# Altium schematic symbol library lib_datalogger.SchLib: 1246 symbols (part 5 of 16) (continued)
## CMP-006-00019-3
designator L?, comment PCMB063T-2R2MS  value 2.2µH  Case/Package: SMD/SMT  Pins: 2  Tolerance: 20%
Shielded Wirewound Inductor, 2.2 uH, +/- 20%, -20 to 120 degC, 2-Pin SMD, RoHS, Tape and Reel
footprint SUSUMU-PCMB063T_V (SMD, 2-Leads, Body 7.8x6.7mm)
footprint SUSUMU-PCMB063T_V (SMD, 2-Leads, Body 7.8x6.7mm)
pins: 1, 2

## CMP-006-00020-3
designator L?, comment VLS252010HBX-2R2M-1  value 2.2µH  Tolerance: 20%  Mounting Technology: SurfaceMount  Pins: 2
Inductor for Power Circuit, 2.2 uH, +/- 20%, -40 to 105 degC, 2-Pin SMD, RoHS, Tape and Reel
footprint SUSUMU-PCMB063T_V (SMD, 2-Leads, Body 7.8x6.7mm)
footprint TDK-VLS252010_V (SMD, 2-Leads, Body 2.5x2mm)
pins: 1, 2

## CMP-006-00021-1
designator L?, comment IND 6.8uH 11.5A SMD  Saturation Current: 11A  Tolerance: 20%  Core Material: Ferrite  RoHS Compliant: Yes  Case/Package: Nonstandard  Inductance: 6.8uH  Packaging: Tape and Reel  Min Operating Temperature: -40°C  Max Operating Temperature: 125°C  Shielding: Shielded  Self Resonant Frequency: 40MHz  Current Rating: 11.5A  Package Quantity: 400
FIXED IND 6.8UH 11.5A 15MOHM SMD; DC Resistance (DCR): 15mR; Series Resistance: 13.2mR; Test Frequency: 100kHz; RMS Current (Irms): 11.5A; Max DC Current: 11A; Number of Pins: 2; Termination: SMD/SMT; Resistor Type: Wirewound; Width: 0.394inch; Height - Seated (Max): 0.382inch; Length: 0.429inch; Mount: Surface Mount; REACH SVHC: Unknown; Height: 9.3mm; Series: WE-HCC; Inductance Tolerance: 20%; Lead Free: Lead Free
footprint WE-HCC-1090 (Inductor, 2-Leads, Body 10.9 x 10.0 mm)
pins: 1, 2

## CMP-007-000000-1
designator U?, comment IC MCP3208
ADC SAR 100ksps 12-bit Serial 16-Pin SOIC N; Part#: MCP9808T-E/MC; Manufacturer Part Number: MCP3208-CI/SL; Manufacturer: Microchip Technology; Differential Nonlinearity: 1LSB; Number of Converters: 1; Number of Channels: 8; Supply Type: Single; Full Scale Error: 5LSB; Sampling Rate: 100KS/s; MSRP: 0,85; Interface: SPI,Serial; eVendor#: MCP9808T-E/MCCT-ND; eVendorPrice: 1,13; eVendor: Digi-Key; Polarity: Unipolar; Max Supply Voltage: 5.5V; Output Voltage: 4.1V; Integral Nonlinearity (INL): 2LSB; Resolution: 12b; Signal to Noise Ratio (SNR): 100dB; Min Supply Voltage: 2.7V; Operating Supply Voltage: 5V; Number of Bits: 12; Nominal Supply Current: 320uA; ComponentLink4Description: https://datasheet.ciiva.com/8065/808967-8065814.pdf?src-supplier=Element14; Design Item ID: IC MCP3208; ComponentLink1URL: https://datasheet.ciiva.com/1256/21298e-1256787.pdf?src-supplier=Digi-Key; Mount: Surface Mount; ComponentLink3URL: https://datasheet.ciiva.com/3038/21298e-3038054.pdf?src-supplier=Avnet; Stock 1: 1106; ComponentLink5URL: https://datasheet.ciiva.com/16389/filehandler-aspxddocname-en011591-16389094.pdf?src-supplier=Future+Electronics; Number of A/D Converters: 1; Obs: --; Category: Analog to Digital Converters (ADCs); MOQ: 100; Number of Inputs: 8; Packaging: Rail/Tube; ComponentLink1Description: https://datasheet.ciiva.com/1256/21298e-1256787.pdf?src-supplier=Digi-Key; Case/Package: SOIC; ComponentLink2Description: https://datasheet.ciiva.com/18411/70045411-18411669.pdf?src-supplier=Allied+Electronics; Height: 1.25mm; ComponentLink2URL: https://datasheet.ciiva.com/18411/70045411-18411669.pdf?src-supplier=Allied+Electronics; Pricing 1: 1=3,48000, 25=2,90000, 100=2,64000 (USD); ComponentLink6URL: https://datasheet.ciiva.com/16608/21298e-16608950.pdf?src-supplier=Avnet+Europe; Min Operating Temperature: -40°C; RoHS: Yes; Lead Free: Lead Free; Package Quantity: 50; Number of Pins: 16; Contact Plating: Tin,Matte; Max Operating Temperature: 85°C; Number of Elements: 1; Radiation Hardening: No; ComponentLink7Description: https://datasheet.ciiva.com/14118/aqmicrochip-a-d-wandler-mcp3204-en-14118170.pdf?src-supplier=Distrelec; Length: 9.9mm; Datasheet: http://www.microchip.com/mymicrochip/filehandler.aspx?ddocname=en556196; Width: 3.9mm; ComponentLink3Description: https://datasheet.ciiva.com/3038/21298e-3038054.pdf?src-supplier=Avnet; Source: mits.SchLib; ComponentLink7URL: https://datasheet.ciiva.com/14118/aqmicrochip-a-d-wandler-mcp3204-en-14118170.pdf?src-supplier=Distrelec; ComponentLink4URL: https://datasheet.ciiva.com/8065/808967-8065814.pdf?src-supplier=Element14; Conversion Rate: 100KS/s; ComponentLink5Description: https://datasheet.ciiva.com/16389/filehandler-aspxddocname-en011591-16389094.pdf?src-supplier=Future+Electronics; ComponentLink6Description: https://datasheet.ciiva.com/16608/21298e-16608950.pdf?src-supplier=Avnet+Europe; REACH SVHC: No SVHC
footprint SOIC-SL16_N (SOIC, 16-Leads, Body 9.9x3.9mm, Pitch 1.27mm, IPC Medium Density)
footprint SOIC-SL16_N (SOIC, 16-Leads, Body 9.9x3.9mm, Pitch 1.27mm, IPC Medium Density)
pins: 1 CH0 (in), 2 CH1 (in), 3 CH2 (in), 4 CH3 (in), 5 CH4 (in), 6 CH5 (in), 7 CH6 (in), 8 CH7 (in), 9 DGND (power), 10 ~{CS}/SHDN (in), 11 DIN (in), 12 DOUT (hiz), 13 CLK (in), 14 AGND (power), 15 VREF (in), 16 VDD (power)

## CMP-007-00000-2
designator DS?, comment 16-219A/T2D-AR2T1QY/3T
Chip LED, White, 5 V, 10 mA, 30 mW, -40 to 85 degC, 2-Pin SMD (0402), RoHS, Tape and Reel; Manufacturer: Everlight Electronics; Luminous Intensity: 360mcd; Forward Voltage: 2.6V; Viewing Angle: 130degrees; Power: 30mW; Forward Current: 5mA; Package Quantity: 3000; Max Operating Temperature: 85°C; Datasheet Version: Rev. 5, 04/2013; Datasheet URL: http://www.everlight.com/file/ProductFile/16-219A-T2D-AR2T1QY-3T.pdf; Package Reference: 0402; Mounting Technology: SM; Case/Package: 0402; Illumination Colour: White; Manufacturer URL: http://www.everlight.com/; Package Description: 2-Pin Surface Mount Device, Body 1 x 0.5 mm; RoHS Compliant: True; Packaging: TapeandReel; Min Operating Temperature: -40°C
footprint EVRL-0402-2_V (SMD, 2-Leads, Body 1x0.5mm)
pins: 1 A, 2 K

## CMP-007-000001-1
designator U?, comment DC/DC CONVERTER 5V 1W
DC DC CONVERTER 5V 1W; Manufacturer Part Number: NKE0505SC; Manufacturer: Murata; Current - Output 1: 200mA; Efficiency: 69%; Isolation: Isolated; Min Input Voltage (DC): 4.5V; Isolation Voltage: 3kV; Number of Outputs: 1; Max Input Voltage: 5.5V; ComponentLink2Description: https://datasheet.ciiva.com/16470/kdc-nke-16470775.pdf?src-supplier=Future+Electronics; Packaging: Rail/Tube; RoHS: Yes; Design Item ID: DC/DC CONVERTER 5V 1W; Category: Voltage Regulators - Switching; Pricing 1: 1=5,08000, 5=5,05000, 10=5,02000, 25=4,96000, 50=4,84000, 100=4,60000, 250=4,30004, 500=4,01002, 1000=3,99000 (USD); ComponentLink1URL: https://datasheet.ciiva.com/26920/nke0505sc-26920257.pdf?src-supplier=IIIC; Max Output Power: 1W; REACH SVHC: No SVHC; Min Operating Temperature: -40°C; Max Power Dissipation: 1W; Lead Free: Lead Free; Length: 11.48mm; Nominal Input Voltage: 5V; Radiation Hardening: No; Max Output Current: 200mA; Mount: Through Hole; Voltage - Output 1: 5V; Max Operating Temperature: 85°C; Depth: 6mm; Stock 1: 4067; Case/Package: SIP; Source: mits.SchLib; Package Quantity: 40; ComponentLink2URL: https://datasheet.ciiva.com/16470/kdc-nke-16470775.pdf?src-supplier=Future+Electronics; Width: 0.24inch; ComponentLink3Description: https://datasheet.ciiva.com/8011/1790387-8011755.pdf?src-supplier=Element14; Number of Pins: 4; ComponentLink1Description: https://datasheet.ciiva.com/26920/nke0505sc-26920257.pdf?src-supplier=IIIC; Output Voltage: 5V; Nominal Output Voltage: 5V; Output Power: 1W; Height: 0.29inch; Flammability Rating: UL94 V-0; Min Input Voltage: 4.5V; Output Current: 200mA; Max Input Voltage (DC): 5.5V; ComponentLink3URL: https://datasheet.ciiva.com/8011/1790387-8011755.pdf?src-supplier=Element14
footprint B_XT-1WR2
footprint SIP_4
pins: 1 -VIN (power), 2 +VIN (power), 3 -VOUT (power), 4 +VOUT (power)

## CMP-007-00001-2
designator U?, comment 1655
Intelligent Control LED Integrated Light Source, 3.5 to 5.3 V, -25 to 80 degC, 4-Pin SMD, RoHS, Tape and Reel; Manufacturer: Adafruit Industries; RoHS Compliant: True; Case/Package: 1655; Package Description: 4-Pin Surface Mount Device, Body 5 x 5 mm; Manufacturer URL: https://www.adafruit.com/; Package Reference: 1655; Datasheet URL: http://datasheet.octopart.com/ADA1655-Adafruit-Industries-datasheet-32028139.pdf; Datasheet Version: May-13; Mounting Technology: SM
footprint ADA-RGB-1655_V (SMD, 4-Leads, Body 5x5mm)
pins: 1 VDD (power), 2 DOUT (out), 3 VSS (power), 4 DIN (in)

## CMP-00007-2
designator IC?, comment IC MC7805CT-BP REGULATOR TO-220
Standard Regulator Pos 5V 1.5A 3-Pin(3+Tab) TO-220 Bulk; Power Dissipation: 15kW; Max Input Voltage: 35V; Max Power Dissipation: 15W; Min Input Voltage: 7V; Number of Outputs: 1; Polarity: Positive; Power Supply Rejection Ratio (PSRR): 78dB; Dropout Voltage: 2V; Quiescent Current: 8mA; Output Type: Fixed; Nominal Output Voltage: 5V; Number of Pins: 3; Mount: Through Hole; Radiation Hardening: No; Package Quantity: 50; RoHS Compliant: Yes; Case/Package: TO-220; Packaging: Bulk; Series: -; Lead Free: Lead Free; Output Voltage: 5V; Max Operating Temperature: 125°C; Output Current: 1.5A; Number of Regulators: 1; Min Operating Temperature: 0°C; REACH SVHC: Unknown
footprint IC MC7805CT-BP REGULATOR TO-220-Footprint-1
pins: 1 IN (power), 2 GND (power), 3 OUT (power)

## CMP-007-000002-1
designator U?, comment DC/DC CONVERTER 24V / 12V 1W
DC/DC CONVERTER 24V/12V 1W; ComponentLink1Description: http://power.murata.com/data/power/ncl/kdc_nke.pdf; Design Item ID: DC/DC CONVERTER 24V / 12V 1W; ComponentLink1URL: http://power.murata.com/data/power/ncl/kdc_nke.pdf; Source: mits.SchLib
footprint B_XT-1WR2
pins: 1 -VIN (power), 2 +VIN (power), 3 -VOUT (power), 4 +VOUT (power)

## CMP-007-00002-2
designator DS?, comment 19-217-G7C-AN1P2-3T
Chip LED, Yellow-Green, 5 V, 25 mA, -40 to 85 degC, 2-Pin SMD (0603), RoHS, Tape and Reel; Manufacturer: Everlight Electronics; Forward Voltage: 2V; Lens Style: Clear; Viewing Angle: 120degrees; Colour: Green; Mounting Technology: SM; Datasheet Version: Rev. 1, 04/2006; Package Description: 2-Pin Surface Mount Device, Body 1.6 x 0.8 mm; RoHS Compliant: True; Package Reference: 0603; Pins: 2; Manufacturer URL: http://www.everlight.com/; Datasheet URL: https://datasheet.ciiva.com/48679/19-217-g7c-an1p2-3t-48679179.pdf; Case/Package: 0603
footprint EVRL-0603-2_V (SMD, 2-Leads, Body 1.6x0.8mm)
pins: 1 A, 2 K

## CMP-007-00003-2
designator DS?, comment 19-217/BHC-ZL1M2RY/3T
Chip LED, Blue, 5 V, 25 mA, -40 to 85 degC, 2-Pin SMD (0603), RoHS, Tape and Reel; Manufacturer: Everlight Electronics; Luminous Intensity: 28.5mcd; Viewing Angle: 120degrees; Forward Current: 25mA; Lens Style: Diffused; Forward Voltage: 3V; Pins: 2; Max Operating Temperature: 85°C; Manufacturer URL: http://www.everlight.com/; Datasheet URL: https://datasheet.ciiva.com/26901/getdatasheetpartid-420616-26901324.pdf; Package Reference: 0603; RoHS Compliant: True; Packaging: TapeandReel; Package Description: 2-Pin Surface Mount Device, Body 1.6 x 0.8 mm; Mounting Technology: SM; Datasheet Version: Rev. 1.0, 03/2003; Min Operating Temperature: -40°C; Case/Package: 0603; Colour: Blue
footprint EVRL-0603-2_V (SMD, 2-Leads, Body 1.6x0.8mm)
pins: 1 A, 2 K

## CMP-007-00004-2
designator DS?, comment 19-217/R6C-AL1M2VY/3T
Chip LED, Red, 5 V, 25 mA, -40 to 85 degC, 2-Pin SMD (0603), RoHS, Tape and Reel; Manufacturer: Everlight Electronics; Forward Voltage: 2.2V; Lens Style: Clear; Package Reference: 0603; Datasheet Version: Rev. 1, 01/2005; Mounting Technology: SM; RoHS Compliant: False; Datasheet URL: https://datasheet.ciiva.com/4688/el-19-217-r6c-al1m2vy-3tpdf-187026-4688713.pdf; Case/Package: 0603; Colour: Red; Manufacturer URL: http://www.everlight.com/; Package Description: 2-Pin Surface Mount Device, Body 1.6 x 0.8 mm
footprint EVRL-0603-2_V (SMD, 2-Leads, Body 1.6x0.8mm)
pins: 1 A, 2 K

## CMP-007-000005-1
designator S?, comment DC/DC CONVERTER NKE0303SC 3.3V 1W
DC/DC CONVERTER 3.3V 1W; Manufacturer: Murata Power Solutions Inc.; Efficiency: 72%; Voltage - Input (Min): 3V; Current - Output (Max): 303mA; Voltage - Isolation: 3kV (3000V); Voltage - Input (Max): 3.6V; Number of Outputs: 1; Voltage - Output 1: 3.3V; Voltage - Output 3: -; Operating Temperature: -40°C ~ 85°C; Packaging: Tube; Voltage - Output 2: -; Size / Dimension: 0.45" L x 0.24" W x 0.29" H (11.5mm x 6.0mm x 7.5mm); Mounting Type: Through Hole; Pricing 1: 1=7.61, 5=7.57, 10=7.52, 25=7.43, 50=7.25, 100=6.89, 250=6.45004, 500=6.01002, 1000=5.985 (USD); Type: Isolated Module; Manufacturer Part Number: NKE0303SC; Applications: ITE (Commercial); Part Status: Active; ComponentLink1URL: http://power.murata.com/data/power/ncl/kdc_nke.pdf; Source: mits.SchLib; Features: -; Package / Case: 4-SIP Module; RoHS: RoHS Compliant; Stock 1: 1554; Design Item ID: DC/DC CONVERTER NKE0303SC 3.3V 1W; Power (Watts) - Manufacture Series: 1W; Category: Power Supplies - Board Mount; ComponentLink1Description: http://power.murata.com/data/power/ncl/kdc_nke.pdf
footprint SWITCH_TOGGLE_TH
footprint SIP_4
pins: 1, 2

## CMP-007-00005-2
designator DS?, comment 19-217/Y5C-AM1N1VY/3T
Chip LED, Yellow, 5 V, 25mA, -40 to 85 degC, 2-Pin SMD (0603), RoHS, Tape and Reel; Manufacturer: Everlight Electronics; Datasheet Version: Rev. 1.0, 12/2005; Package Reference: 0603; Mounting Technology: SM; Package Description: 2-Pin Surface Mount Device, Body 1.6 x 0.8 mm; Case/Package: 0603; Datasheet URL: http://www.fairchip.com/pdf/Everlight/19-217-Y5C-AM1N1VY-3T.pdf; Manufacturer URL: http://www.everlight.com/; RoHS Compliant: False
footprint EVRL-0603-2_V (SMD, 2-Leads, Body 1.6x0.8mm)
pins: 1 A, 2 K

## CMP-007-000006-1
designator U?, comment DC/DC CONVERTER PHP1S5S5MTR 5V 1W
DC DC CONVERTER 5V 1W; Manufacturer: CUI; Manufacturer Part Number: PHP1-S5-S5-M-TR; Isolation Voltage: 2kV; Min Input Voltage: 4.5V; Max Output Current: 200mA; Max Input Voltage: 5.5V; Efficiency: 75%; Number of Outputs: 1; Max Power Dissipation: 1W; Category: Board Mount Modules; ComponentLink1Description: http://power.murata.com/data/power/ncl/kdc_nke.pdf; ComponentLink1URL: http://power.murata.com/data/power/ncl/kdc_nke.pdf; Voltage - Output 1: 5V; Length: 0.5inch; ComponentLink3URL: http://www.cui.com/product/resource/digikeypdf/php1-m.pdf?src-supplier=Digi-Key; Design Item ID: DC/DC CONVERTER PHP1S5S5MTR 5V 1W; Source: mits.SchLib; Case/Package: SMD/SMT; Height: 0.26inch; ComponentLink3Description: http://www.cui.com/product/resource/digikeypdf/php1-m.pdf?src-supplier=Digi-Key; Packaging: Rail/Tube; Pricing 1: 1=3,98000, 5=3,92600, 10=3,87000, 25=3,75600, 50=3,64200, 100=3,52830, 250=3,41444 (USD); Min Operating Temperature: -40°C; Max Operating Temperature: 100°C; Width: 0.42inch; ComponentLink2Description: https://www.cui.com/product/resource/digikeypdf/php1-m.pdf?src-supplier=Digi-Key; Stock 1: 1306; RoHS: Yes; ComponentLink2URL: https://www.cui.com/product/resource/digikeypdf/php1-m.pdf?src-supplier=Digi-Key; Lead Free: Lead Free; Mount: Through Hole
footprint B_XT-1WR2
footprint B_XT-1WR2
pins: 1 -VIN (power), 2 +VIN (power), 3 -VOUT (power), 4 +VOUT (power)

## CMP-007-00006-2
designator DS?, comment 304090040
Green LED, 80 mW, 20 mA, -25 to 85 degC, 2-Pin THD; Manufacturer: Shenzhen CGX; Manufacturer URL: http://szcgx.com/; Package Reference: 304090040; Datasheet Version: Rev. 1.0, 09/2014; RoHS Compliant: Unknown; Case/Package: 304090040; Package Description: 2-Pin Through Hole Device, Dia 3 mm, Pitch 2.28 mm; Datasheet URL: http://datasheet.octopart.com/304090040-Chengguangxing-datasheet-62330655.pdf; Mounting Technology: TH
footprint LED-2P-2.28-3MM (LED, 2-Leads, Dia 3mm, Pitch 2.28mm)
pins: 1 A, 2 K

## CMP-007-00007-2
designator DS?, comment 304090041
Red LED, 80 mW, 30 mA, -25 to 85 degC, 2-Pin THD; Manufacturer: Shenzhen CGX; Package Description: 2-Pin Through Hole Device, Dia 3 mm, Pitch 2.28 mm; Datasheet URL: http://datasheet.octopart.com/304090041-Chengguangxing-datasheet-62330656.pdf; Mounting Technology: TH; Manufacturer URL: http://szcgx.com/; RoHS Compliant: Unknown; Datasheet Version: Sep-14; Case/Package: 304090041; Package Reference: 304090041
footprint LED-2P-2.28-3MM_A (LED, 2-Leads, Dia 3mm, Pitch 2.28mm)
pins: 1 A, 2 K

## CMP-007-00008-2
designator DS?, comment G502DC
Green LED, 80 mW, 20 mA, -25 to 85 degC, 2-Pin THD; Manufacturer: Shenzhen CGX; Mounting Technology: TH; Package Reference: G502DC; Datasheet Version: Sep-14; Manufacturer URL: http://szcgx.com/; Package Description: 2-Pin Through Hole Device, Dia 5.9 mm; Datasheet URL: http://datasheet.octopart.com/G502DC-Chengguangxing-datasheet-62330340.pdf; Case/Package: G502DC; RoHS Compliant: Unknown
footprint CGX-G502DC (THD, 2-Leads, Dia 5.9mm, Pin Spacing 2.54mm)
pins: 1 A, 2 K

## CMP-007-00009-3
designator DS?, comment UR502DC
Red LED, 80 mW, 30 mA, -25 to 85 degC, 2-Pin THD; Manufacturer: Shenzhen CGX; Power: 80mW; Manufacturer URL: http://szcgx.com/; Package Description: 2-Pin Through Hole Device, Dia 5.9 mm, Height 9.1 mm; Case/Package: UR502DC; RoHS Compliant: Unknown; Package Reference: UR502DC; Mounting Technology: TH; Datasheet URL: http://datasheet.octopart.com/UR502DC-Chengguangxing-datasheet-62330342.pdf; Datasheet Version: Sep-14
footprint CGX-UR502DC (THD, 2-Leads, Dia 5.9mm, Pin Spacing 2.54mm)
footprint CGX-UR502DC (THD, 2-Leads, Dia 5.9mm, Pin Spacing 2.54mm)
pins: 1 A, 2 K

## CMP-007-00010-2
designator DS?, comment WP7113SGD
LED Green, 62.5 mW, 25 mA, -40 to 85 degC, 2-Pin THD, RoHS, Bulk; Manufacturer: Kingbright; Lens Style: Dome; Nominal Vf: 2.2V; Power: 62.5mW; Luminous Intensity: 40mcd; Viewing Angle: 30degrees; Datasheet URL: http://www.kingbrightusa.com/images/catalog/SPEC/WP7113SGD.pdf; Datasheet Version: Rev. 6B, 01/2015; Illumination Colour: Green; Package Quantity: 1000; Package Description: 2-Pin Through Hole Device, Dia 5.9 mm, Body Length 8.6 mm; Colour: Green; Case/Package: Radial; RoHS Compliant: True; Package Reference: WP7113SGD; Mounting Technology: TH; Packaging: Bulk; Forward Voltage: 2.2V
footprint KING-WP7113SGD_V (THD, 2-Leads, Dia 5.9mm, Body Length 8.6mm)
pins: 1 A, 2 K

## CMP-007-00011-2
designator DS?, comment HSMA-C190
LED Uni-Color Amber, 60 mW, 20 mA, -40 to 85 degC, 2-Pin SMD, RoHS, Tape and Reel; Manufacturer: Avago; Forward Current: 20mA; Colour: Orange; Luminous Intensity: 90mcd; Lens Style: Diffused; Power: 60mW; Nominal Vf: 1.9V; Viewing Angle: 170degrees; Datasheet Version: Sep-10; Mounting Technology: SM; Case/Package: 0603; RoHS Compliant: True; Pins: 2; Packaging: TapeandReel; Package Reference: HSMX-C190; Manufacturer URL: http://www.avagotech.com/; Package Quantity: 4000; Min Operating Temperature: -40°C; Datasheet URL: http://docs.avagotech.com/docs/AV02-0112EN; Max Operating Temperature: 85°C; Forward Voltage: 1.9V; Package Description: 2-Pin Surface Mount Device, Body 1.6 x 0.8 mm, Height 0.9 mm; Illumination Colour: Orange
footprint AVAG-HSMX-C190_V (SMD, 2-Leads, Body 1.6x0.8mm, Height 0.9mm)
pins: 1 A, 2 K

## CMP-007-00012-2
designator DS?, comment HSMD-C190
LED Uni-Color Orange, 52 mW, 20 mA, -40 to 85 degC, 2-Pin SMD, RoHS, Tape and Reel; Manufacturer: Avago; Lens Style: Diffused; Forward Voltage: 2.2V; Forward Current: 20mA; Viewing Angle: 170degrees; Power: 52mW; Luminous Intensity: 8mcd; Min Operating Temperature: -40°C; Packaging: TapeandReel; Colour: Orange; Nominal Vf: 2.2V; Pins: 2; Case/Package: 0603; Max Operating Temperature: 85°C; Illumination Colour: Orange; Package Description: 2-Pin Surface Mount Device, Body 1.6 x 0.8 mm, Height 0.9 mm; Manufacturer URL: http://www.avagotech.com/; Datasheet Version: Mar-12; RoHS Compliant: True; Datasheet URL: http://docs.avagotech.com/docs/AV02-0551EN; Mounting Technology: SM; Package Reference: HSMX-C190; Package Quantity: 4000
footprint AVAG-HSMX-C190_V (SMD, 2-Leads, Body 1.6x0.8mm, Height 0.9mm)
pins: 1 A, 2 K

## CMP-007-00013-2
designator DS?, comment HSMG-C190
LED Uni-Color Green, 52 mW, 20 mA, -40 to 85 degC, 2-Pin SMD, RoHS, Tape and Reel; Manufacturer: Avago; Forward Current: 20mA; Viewing Angle: 170degrees; Luminous Intensity: 15mcd; Lens Style: Diffused; Forward Voltage: 2.2V; Power: 52mW; Mounting Technology: SM; RoHS Compliant: True; Packaging: TapeandReel; Illumination Colour: Green; Datasheet URL: http://docs.avagotech.com/docs/AV02-0551EN; Min Operating Temperature: -40°C; Max Operating Temperature: 85°C; Pins: 2; Package Description: 2-Pin Surface Mount Device, Body 1.6 x 0.8 mm, Height 0.9 mm; Nominal Vf: 2.2V; Case/Package: 0603; Manufacturer URL: http://www.avagotech.com/; Datasheet Version: Mar-12; Colour: Green; Package Reference: HSMX-C190; Package Quantity: 4000
footprint AVAG-HSMX-C190_V (SMD, 2-Leads, Body 1.6x0.8mm, Height 0.9mm)
pins: 1 A, 2 K

## CMP-007-00014-2
designator DS?, comment HSMH-C190
LED Uni-Color Red, 65 mW, 20 mA, -40 to 85 degC, 2-Pin SMD, RoHS, Tape and Reel; Manufacturer: Avago; Nominal Vf: 1.8V; Luminous Intensity: 17mcd; Power: 78mW; Forward Current: 20mA; Lens Style: Diffused; Viewing Angle: 170degrees; Package Quantity: 4000; Colour: Red; Manufacturer URL: http://www.avagotech.com/; Min Operating Temperature: -40°C; Datasheet URL: http://docs.avagotech.com/docs/AV02-0551EN; RoHS Compliant: True; Forward Voltage: 1.8V; Pins: 2; Max Operating Temperature: 85°C; Packaging: TapeandReel; Package Reference: HSMX-C190; Datasheet Version: Mar-12; Package Description: 2-Pin Surface Mount Device, Body 1.6 x 0.8 mm, Height 0.9 mm; Case/Package: 0603; Mounting Technology: SM; Illumination Colour: Red
footprint AVAG-HSMX-C190_V (SMD, 2-Leads, Body 1.6x0.8mm, Height 0.9mm)
pins: 1 A, 2 K

## CMP-007-00015-2
designator DS?, comment HSMR-C190
LED Uni-Color Blue, 78 mW, 20 mA, -40 to 85 degC, 2-Pin SMD, RoHS, Tape and Reel; Manufacturer: Avago; Forward Voltage: 3.4V; Power: 78mW; Forward Current: 20mA; Luminous Intensity: 55mcd; Lens Style: Diffused; Viewing Angle: 155degrees; Pins: 2; Max Operating Temperature: 85°C; Colour: Blue; Datasheet Version: Apr-10; RoHS Compliant: True; Mounting Technology: SM; Min Operating Temperature: -40°C; Illumination Colour: Blue; Package Quantity: 4000; Datasheet URL: http://docs.avagotech.com/docs/AV02-0977EN; Package Reference: HSMX-C190; Packaging: TapeandReel; Nominal Vf: 3.4V; Case/Package: 0603; Package Description: 2-Pin Surface Mount Device, Body 1.6 x 0.8 mm, Height 0.9 mm; Manufacturer URL: http://www.avagotech.com/
footprint AVAG-HSMX-C190_V (SMD, 2-Leads, Body 1.6x0.8mm, Height 0.9mm)
pins: 1 A, 2 K

## CMP-007-00016-2
designator DS?, comment HSMW-C191
LED Uni-Color White, 78 mW, 20 mA, -40 to 85 degC, 2-Pin SMD, RoHS, Tape and Reel; Manufacturer: Avago; Power: 78mW; Lens Style: Diffused; Luminous Intensity: 200mcd; Forward Voltage: 3.6V; Viewing Angle: 140degrees; Forward Current: 20mA; Illumination Colour: White; Package Quantity: 4000; Mounting Technology: SM; Colour: White; Case/Package: 0603; Package Reference: HSMW-C191; Datasheet Version: May-10; Pins: 2; Package Description: 2-Pin Surface Mount Device, Body 1.6 x 0.8 mm; Min Operating Temperature: -40°C; RoHS Compliant: True; Packaging: TapeandReel; Manufacturer URL: http://www.avagotech.com/; Datasheet URL: http://docs.avagotech.com/docs/AV02-0186EN; Nominal Vf: 3.6V; Max Operating Temperature: 85°C
footprint AVAG-HSMW-C191_V (SMD, 2-Leads, Body 1.6x0.8mm)
pins: 1 A, 2 K

## CMP-007-00017-2
designator DS?, comment HSMY-C190
LED Uni-Color Yellow, 65 mW, 20 mA, -40 to 85 degC, 2-Pin SMD, RoHS, Tape and Reel; Manufacturer: Avago; Forward Current: 20mA; Viewing Angle: 170degrees; Power: 52mW; Lens Style: Diffused; Nominal Vf: 2.1V; Luminous Intensity: 8mcd; Max Operating Temperature: 85°C; Package Quantity: 4000; Package Description: 2-Pin Surface Mount Device, Body 1.6 x 0.8 mm, Height 0.9 mm; Packaging: TapeandReel; Case/Package: 0603; Datasheet Version: Mar-12; Min Operating Temperature: -40°C; Pins: 2; Illumination Colour: Yellow; Package Reference: HSMX-C190; Colour: Yellow; Manufacturer URL: http://www.avagotech.com/; Datasheet URL: http://docs.avagotech.com/docs/AV02-0551EN; Forward Voltage: 2.1V; RoHS Compliant: True; Mounting Technology: SM
footprint AVAG-HSMX-C190_V (SMD, 2-Leads, Body 1.6x0.8mm, Height 0.9mm)
pins: 1 A, 2 K

## CMP-007-00018-2
designator DS?, comment LTL-1CHE
LED Uni-Color Red, 100 mW, 30 mA, -55 to 100 degC, 2-Pin THD, RoHS, Bulk; Manufacturer: Lite-On; Forward Current: 20mA; Nominal Vf: 2V; Viewing Angle: 60degrees; Luminous Intensity: 12.6mcd; Lens Style: Dome; Pins: 2; RoHS Compliant: True; Package Reference: LTL-1CHE; Package Quantity: 1000; Mounting Technology: TH; Min Operating Temperature: -55°C; Colour: Red; Case/Package: Radial; Manufacturer URL: http://www.us.liteon.com/; Datasheet URL: https://datasheet.ciiva.com/15117/getdatasheetpartid-187746-15117985.pdf; Forward Voltage: 2V; Max Operating Temperature: 100°C; Illumination Colour: Red; Package Description: 2-Pin Through Hole Device, Dia 3.8 mm, Pitch 2.54 mm; Packaging: Bulk; Datasheet Version: Dec-03
footprint INDPR60-254-520X380X650 (THD, 2-Leads, Dia 3.8mm, Pitch 2.54mm)
pins: 1 A, 2 K

## CMP-007-00019-2
designator DS?, comment LTL-1CHG
LED Uni-Color Green, 100 mW, 30 mA, -55 to 100 degC, 2-Pin THD, RoHS, Bulk; Manufacturer: Lite-On; Power: 100mW; Forward Voltage: 2.6V; Forward Current: 30mA; Nominal Vf: 2.1V; Lens Style: Dome; Viewing Angle: 60degrees; Luminous Intensity: 12.6mcd; Max Operating Temperature: 100°C; Case/Package: Radial; Package Reference: LTL-1CHG; Manufacturer URL: http://www.us.liteon.com/; Package Quantity: 1000; Colour: Green; Packaging: Bulk; RoHS Compliant: True; Datasheet URL: http://datasheet.octopart.com/LTL-1CHG-Lite-On-datasheet-143841.pdf; Package Description: 2-Pin Through Hole Device, Dia 3.8 mm; Min Operating Temperature: -55°C; Mounting Technology: TH; Pins: 2; Illumination Colour: Green; Datasheet Version: Mar-00
footprint LTST-LTL-1CHG-2 (TH, 2-Leads, Dia 3.8mm)
pins: 1 A, 2 K

## CMP-007-00020-2
designator DS?, comment LTL-1CHYE
LED Uni-Color Yellow, 60 mW, 20 mA, -55 to 100 degC, 2-Pin THD, RoHS, Bulk; Manufacturer: Lite-On; Nominal Vf: 2.1V; Luminous Intensity: 40mcd; Lens Style: Dome; Forward Current: 20mA; Viewing Angle: 45degrees; Max Operating Temperature: 100°C; Case/Package: Radial; Min Operating Temperature: -55°C; Colour: Yellow; Datasheet Version: Rev. B, 07/2013; Packaging: Bulk; Illumination Colour: Yellow; Package Quantity: 1000; Pins: 2; Package Reference: LTL-1CHYE; Forward Voltage: 2.1V; Mounting Technology: TH; Datasheet URL: https://datasheet.ciiva.com/4269/s-110-ltl-1chye-4269126.pdf; RoHS Compliant: True; Package Description: 2-Pin Through Hole Device, Dia 3.8 mm, Pitch 2.54 mm; Manufacturer URL: http://www.us.liteon.com/
footprint LTST-LTL-1CHYE (THD, 2-Leads, Dia 3.8mm, Pitch 2.54mm)
pins: 1 A, 2 K

## CMP-007-00021-2
designator DS?, comment LTST-C190AKT
LED Uni-Color Orange, 100 mW, 30 mA, -55 to 85 degC, 2-Pin SMD, RoHS, Tape and Reel; Manufacturer: Lite-On; Lens Style: Clear; Forward Voltage: 2.1V; Luminous Intensity: 2mcd; Forward Current: 20mA; Viewing Angle: 130degrees; Package Reference: LTST-C190AKT-2; Case/Package: 0603; Min Operating Temperature: -55°C; Package Quantity: 3000; Illumination Colour: Orange; RoHS Compliant: True; Mounting Technology: SM; Manufacturer URL: http://www.us.liteon.com/; Datasheet URL: http://datasheet.octopart.com/LTST-C190AKT-Lite-On-datasheet-11729267.pdf; Pins: 2; Max Operating Temperature: 85°C; Packaging: TapeandReel; Colour: Orange; Nominal Vf: 2.1V; Datasheet Version: Jan-03; Package Description: 2-Pin Surface Mount Device, Body 1.6 x 0.8 mm
footprint LTST-C190AKT-2_V (SMD, 2-Leads, Body 1.6x0.8mm)
pins: 1 A, 2 K

## CMP-007-00022-2
designator DS?, comment LTST-C190GKT
LED Uni-Color Green, 100 mW, 30 mA, -55 to 85 degC, 2-Pin SMD, RoHS, Tape and Reel; Manufacturer: Lite-On; Power: 100mW; Forward Voltage: 2.1V; Viewing Angle: 130degrees; Forward Current: 20mA; Luminous Intensity: 6mcd; Lens Style: Clear; Manufacturer URL: http://www.us.liteon.com/; RoHS Compliant: True; Colour: Green; Package Description: 2-Pin Surface Mount Device, Body 1.6 x 0.8 mm; Datasheet URL: http://datasheet.octopart.com/LTST-C190GKT-Lite-On-datasheet-158530.pdf; Datasheet Version: Dec-06; Mounting Technology: SM; Case/Package: 0603; Package Reference: C190GKT; Packaging: TapeandReel; Min Operating Temperature: -55°C; Nominal Vf: 2.1V; Package Quantity: 3000; Illumination Colour: Green; Max Operating Temperature: 85°C; Pins: 2
footprint LTST-C190GKT_V (SMD, 2-Leads, Body 1.6x0.8mm)
pins: 1 A, 2 K

## CMP-007-00023-2
designator DS?, comment LTST-C190KFKT
LED Uni-Color Orange, 75 mW, 30 mA, -35 to 85 degC, 2-Pin SMD, RoHS, Tape and Reel; Manufacturer: Lite-On; Power: 75mW; Luminous Intensity: 90mcd; Nominal Vf: 2V; Lens Style: Diffused; Forward Current: 20mA; Viewing Angle: 130degrees; Max Operating Temperature: 85°C; Manufacturer URL: http://www.us.liteon.com/; Package Description: 2-Pin Surface Mount Device, Body 1.6 x 0.8 mm; Package Quantity: 3000; Pins: 2; Min Operating Temperature: -55°C; Mounting Technology: SM; Colour: Orange; Packaging: TapeandReel; Case/Package: 0603; Datasheet Version: Rev. I, 09/2011; Illumination Colour: Orange; Datasheet URL: http://optoelectronics.liteon.com/upload/download/DS-22-99-0186/S_110_LTST-C190KFKT.pdf; Package Reference: C190KFKT; RoHS Compliant: True; Forward Voltage: 2V
footprint LTST-C190KFKT_V (SMD, 2-Leads, Body 1.6x0.8mm)
pins: 1 A, 2 K

## CMP-007-00024-2
designator DS?, comment LTST-C190KRKT
LED Uni-Color Red, 62.5 mW, 25 mA, -30 to 85 degC, 2-Pin SMD, RoHS, Tape and Reel; Manufacturer: Lite-On; Power: 75mW; Forward Voltage: 2V; Luminous Intensity: 54mcd; Lens Style: Diffused; Viewing Angle: 130degrees; Forward Current: 20mA; Manufacturer URL: http://www.us.liteon.com/; Case/Package: 0603; Datasheet Version: Rev. F, 05/2013; Package Reference: C191KRKT; Datasheet URL: http://optoelectronics.liteon.com/upload/download/DS-22-99-0151/S_110_LTST-C190KRKT.pdf; Package Description: 2-Pin Surface Mount Device, Body 1.6 x 0.8 mm; Nominal Vf: 2V; Packaging: TapeandReel; RoHS Compliant: True; Pins: 2; Illumination Colour: Red; Colour: Red; Mounting Technology: SM; Package Quantity: 3000; Min Operating Temperature: -55°C; Max Operating Temperature: 85°C
footprint LTST-C191KRKT_V (SMD, 2-Leads, Body 1.6x0.8mm)
pins: 1 A, 2 K

## CMP-007-00025-2
designator DS?, comment LTST-C190KSKT
LED Uni-Color Yellow, 75 mW, 30 mA, -30 to 85 degC, 2-Pin SMD, RoHS, Tape and Reel; Manufacturer: Lite-On; Lens Style: Diffused; Forward Current: 20mA; Nominal Vf: 2.1V; Forward Voltage: 2V; Luminous Intensity: 28mcd; Viewing Angle: 130degrees; Power: 75mW; Case/Package: 0603; Datasheet URL: http://optoelectronics.liteon.com/upload/download/DS-22-99-0189/S_110_LTST-C190KSKT.pdf; Min Operating Temperature: -55°C; Illumination Colour: Yellow; Package Quantity: 3000; Datasheet Version: Rev. I, 10/2012; Colour: Yellow; Package Reference: C190KSKT; Package Description: 2-Pin Surface Mount Device, Body 1.6 x 0.8 mm; Max Operating Temperature: 85°C; Manufacturer URL: http://www.us.liteon.com/; Pins: 2; Mounting Technology: SM; RoHS Compliant: True; Packaging: TapeandReel
footprint LTST-C190KSKT_V (SMD, 2-Leads, Body 1.6x0.8mm)
pins: 1 A, 2 K

## CMP-007-00026-2
designator DS?, comment LTST-C190TBKT
LED Uni-Color Blue, 76 mW, 20 mA, -20 to 80 degC, 2-Pin SMD, RoHS, Tape and Reel; Manufacturer: Lite-On; Forward Voltage: 2.8V; Lens Style: Diffused; Luminous Intensity: 28mcd; Forward Current: 20mA; Viewing Angle: 130degrees; Nominal Vf: 3.3V; Packaging: TapeandReel; Min Operating Temperature: -20°C; Illumination Colour: Blue; Package Quantity: 3000; Pins: 2; Mounting Technology: SM; Package Reference: C190TBKT-2; Package Description: 2-Pin Surface Mount Device, Body 1.6 x 0.8 mm; RoHS Compliant: True; Datasheet URL: http://optoelectronics.liteon.com/upload/download/DS-22-99-0224/S_110_LTST-C190TBKT(0630).pdf; Datasheet Version: Rev. K, 08/2011; Manufacturer URL: http://www.us.liteon.com/; Colour: Blue; Case/Package: 0603; Max Operating Temperature: 80°C
footprint LTST-C190TBKT-2_V (SMD, 2-Leads, Body 1.6x0.8mm)
pins: 1 A, 2 K

## CMP-007-00027-2
designator DS?, comment LTW-C191TS5
LED Uni-Color White, 70 mW, 20 mA, -20 to 80 degC, 2-Pin SMD, RoHS, Tape and Reel; Manufacturer: Lite-On; Power: 70mW; Forward Current: 5mA; Viewing Angle: 130degrees; Luminous Intensity: 28mcd; Lens Style: Diffused; Nominal Vf: 2.93V; Forward Voltage: 3.15V; Pins: 2; Illumination Colour: White; Datasheet Version: Rev. B, 06/2010; Package Quantity: 1; Colour: White; Package Reference: LTW-C191TS5; Mounting Technology: SM; Package Description: 2-Pin Surface Mount Device, Body 1.6 x 0.8 mm; Manufacturer URL: http://www.us.liteon.com/; Datasheet URL: http://optoelectronics.liteon.com/upload/download/DS22-2004-201/S_110_LTW-C191TS5.pdf; Max Operating Temperature: 80°C; Case/Package: 0603; RoHS Compliant: True; Min Operating Temperature: -20°C; Packaging: TapeandReel
footprint LTST-LTW-C191TS5_V (SMD, 2-Leads, Body 1.6x0.8mm)
pins: 1 A, 2 K

## CMP-007-00028-2
designator DS?, comment TLMB1100-GS08
Blue LED, 10 mA, 3.9 V, -40 to 100 degC, 2-Pin SMD (0603), RoHS, Tape and Reel; Manufacturer: Vishay Semiconductor; Forward Voltage: 3.9V; Viewing Angle: 160degrees; Power: 68mW; Forward Current: 10mA; Lens Style: Diffused; Luminous Intensity: 5mcd; Case/Package: 0603; Datasheet URL: http://download.siliconexpert.com/pdfs/2016/8/7/12/43/26/667/vsh_/manual/379263299541529tlmb1100.pdf; Illumination Colour: Blue; Datasheet Version: Rev. 2.7, 03/2016; Manufacturer URL: http://www.vishay.com/; Package Reference: 0603; Min Operating Temperature: -40°C; Packaging: TapeandReel; RoHS Compliant: True; Nominal Vf: 3.9V; Mounting Technology: SM; Pins: 2; Package Description: 2-Pin Surface Mount Device, Body 1.6 x 0.8 mm; Colour: Blue; Package Quantity: 3000; Max Operating Temperature: 100°C
footprint VISH-TLMX1100-2_V (SMD, 2-Leads, Body 1.6x0.8mm)
pins: 1 A, 2 K